# Altium footprint library DIP Component.PcbLib: 327 footprints (part 18 of 21)
Each footprint in its own frame and in the unit in brackets; x right, y up, seen from the top. Pads: shape width x height; smd on the part's side, far side on the other; paste and mask are expansions set on the pad; w line width, h text height; cw(c..) or ccw(c..) is an arc to the next point about the centre after c.
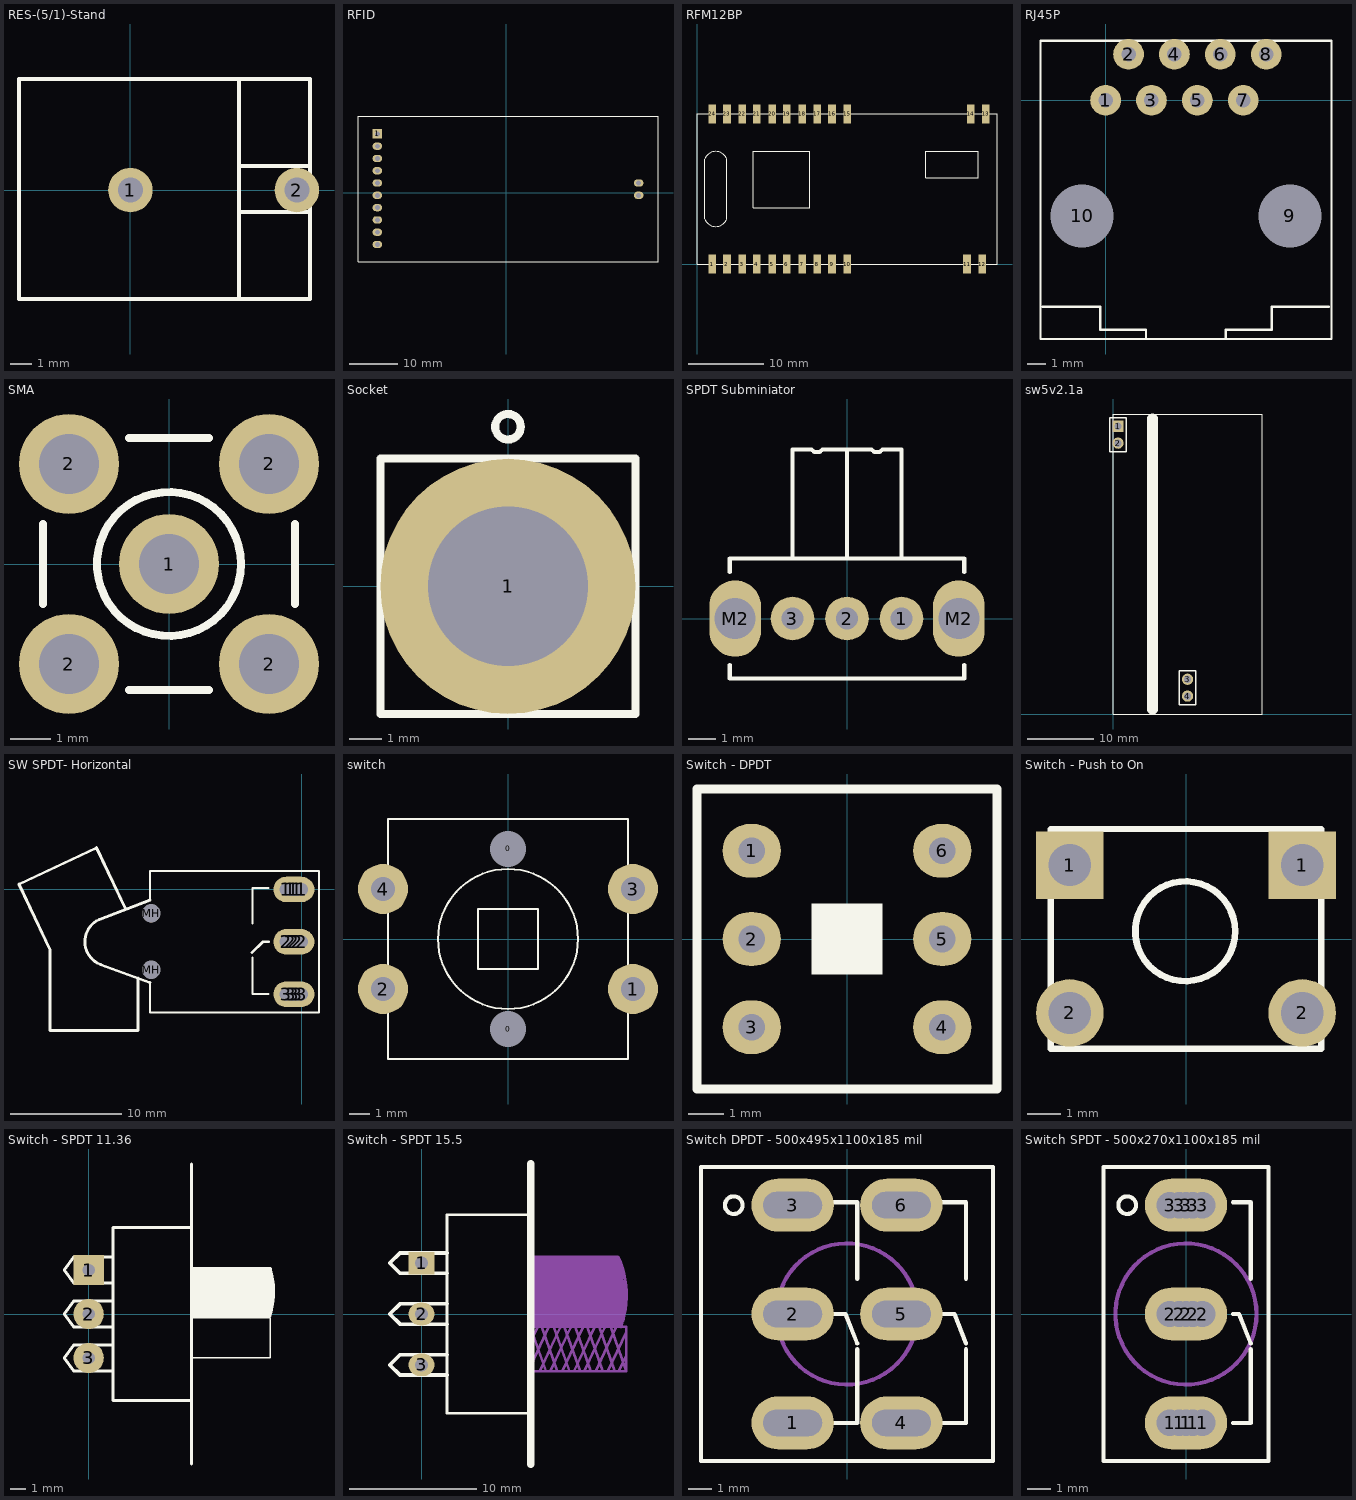
[diagram p17: the footprints below, top view; thin cyan lines are the x and y axes]

## RES-(5/1)-Stand [mil]
pads (2):
  round 80 hole 45: 1(0,0) 2(300,0)
Top Overlay:
  lines w7: 195.69,-196 195.69,200 ; 195.69,-39.37 324,-39.37 ; 195.69,43.31 324,43.31 ; -200.79,-196 324,-196 324,200 -200.79,200 -200.79,-196
3D body "5W Res.STEP": height 907.48, standoff -94.49, extent -195.48,-194 319.48,199.7

## RFID [mm] "RFID 2&10 PIN"
pads (12):
  rect 2x2 hole 1: 1(-26.632,12.141)
  oval 2x1.5 hole 1: 2(-26.632,9.601) 3(-26.632,7.061) 4(-26.632,4.521) 5(-26.632,1.981) 6(-26.632,-0.559) 7(-26.632,-3.099) 8(-26.632,-5.639) 9(-26.632,-8.179) 10(-26.632,-10.719) 11(27.368,1.981) 12(27.368,-0.559)
Top Overlay:
  lines w0.2: -30.632,-14.249 -30.632,15.751 31.368,15.751 31.368,-14.249 -30.632,-14.249
3D body: height 11.1, standoff 0, extent 5.639,-2.184 11.659,6.096
3D body: height 11.1, standoff 0, extent 1.448,-2.21 2.946,6.096
3D body: height 11.1, standoff 0, extent -5.232,-2.261 -0.584,6.096
3D body: height 11.1, standoff 0, extent -13.614,-2.184 -6.579,6.426
3D body: height 11, standoff 0, extent -30.632,-14.249 31.369,15.723

## RFM12BP [mm]
pads (24):
  rect 1x2.5 smd mask+0.5: 1(2,0) 2(4,0) 3(6,0) 4(8,0) 5(10,0) 6(12,0) 7(14,0) 8(16,0) 9(18,0) 10(20,0) 11(36,0) 12(38,0) 13(38.5,20) 14(36.5,20) 15(20,20) 16(18,20) 17(16,20) 18(14,20) 19(12,20) 20(10,20) 21(8,20) 22(6,20) 23(4,20) 24(2,20)
Top Overlay:
  lines w0.1: 0,0 0,20 40,20 40,0 0,0 ; 1,6 ccw(c2.5,6.625) 4,6 4,7.5 4,14 ccw(c2.5,13.375) 1,14 1,7.5 1,6 ; 7.5,7.5 15,7.5 15,15 7.5,15 7.5,10 7.5,7.5 ; 30.5,11.5 37.5,11.5 37.5,15 30.5,15 30.5,14.5 30.5,11.5

## RJ45P [mm]
pads (10):
  round 1.7 hole 0.8: 1(0,0) 2(1.27,2.54) 3(2.54,0) 4(3.81,2.54) 5(5.08,0) 6(6.35,2.54) 7(7.62,0) 8(8.89,2.54)
  round 1.7 hole 3.5: 9(10.2,-6.4) 10(-1.3,-6.4)
Top Overlay:
  lines w0.127: -3.475,-11.43 -0.3,-11.43 -0.3,-12.7 2.24,-12.7 2.24,-13.208 ; 6.65,-13.208 6.65,-12.7 9.19,-12.7 9.19,-11.43 12.365,-11.43 ; -3.6,-13.208 12.5,-13.208 12.5,3.3 -3.6,3.3 -3.6,-13.208
3D body "User Library-CONNECTOR, RJ-45, 8P8C, MOD JACK, TOP ENTRY, CAT 5E, RIA AJT26A8813.step": height 16.3, standoff -3.3, extent -3.3,-12.5 12.2,3.3

## SMA [mm]
pads (5):
  round 2.5 hole 1.5: 1(0,0) 2(-2.5,-2.5) 2(-2.5,2.5) 2(2.5,-2.5) 2(2.5,2.5)
Top Overlay:
  circle w0.2: c0,0 r1.8
  lines w0.2: -3.15,-1 -3.15,1 ; -1,-3.15 1,-3.15 ; -1,3.15 1,3.15 ; 3.15,-1 3.15,1
Mechanical 1:
  circle w0.025: c0,0 r0.2
  circle w0.025: c0,0 r1.05
  circle w0.025: c0,0 r1.8
3D body "User Library-LNB.STEP": height 10.2, standoff -3.5, extent -3.25,-3.25 3.25,3.25

## Socket [mm]
pads (1):
  round 8 hole 5: 1(0,0)
Top Overlay:
  circle w0.254: c0,5 r0.4
  lines w0.254: -4,-4 -4,4 4,4 4,-4 -4,-4
3D body "New Socket-Short.STEP": height 26.7, standoff -4.75, extent -7.075,-7.075 7.075,7.075

## SPDT Subminiator [mm] "Subminiator SPDT switch"
pads (5):
  round 1.6 hole 0.8: 1(2,0) 2(0,0) 3(-2,0)
  oval 1.9x2.8 hole 1.5: M2(-4.1,0) M2(4.1,0)
Top Overlay:
  lines w0.15: -4.3,-1.7 -4.3,-2.2 4.3,-2.2 4.3,-1.7 ; -4.3,1.7 -4.3,2.2 4.3,2.2 4.3,1.7 ; -2,2.2 -2,6.2 ; 0,2.2 0,6.2 ; 2,2.2 2,6.2 1.3,6.2 1.2,6.1 1,6.1 0.9,6.2 0,6.2 ; -2,6.2 -2,6.2 ; -2,6.2 -1.3,6.2 -1.2,6.1 -1,6.1 -0.9,6.2 0,6.2 ; 0,6.2 0,6.2 ; 0,6.2 0,6.2
3D body "User Library-CK_Slide.step": height 4.7, standoff -2.79, extent -4.311,-2.28 4.3,6.093

## sw5v2.1a [mm]
pads (4):
  rect 1.7x1.7 hole 1.1: 1(0.7,43.44)
  round 1.7 hole 1.1: 2(0.7,40.9) 3(11.2,5.24) 4(11.2,2.7)
Top Overlay:
  lines w0.127: 0,0 0,45.3 20.9,45.3 22.5,45.3 22.5,0 0,0
  lines w0.2: -0.57,39.63 1.97,39.63 1.97,44.71 -0.57,44.71 -0.57,39.63 ; 9.93,1.43 9.93,6.51 12.47,6.51 12.47,1.43 9.93,1.43
  lines w1.6: 5.9,0.7 5.9,44.6

## SW SPDT- Horizontal [mil]
pads (17):
  round 90 hole 45: 1(-55.12,0) 1(-39.37,0) 1(-15.75,0) 1(0,0) 2(-55.12,-185.04) 2(-39.37,-185.04) 2(-15.75,-185.04) 2(0,-185.04) 3(-55.12,-370.08) 3(-39.37,-370.08) 3(-15.75,-370.08) 3(0,-370.08)
  oval 140x90 hole 45: 1(-27.56,-0.04) 2(-27.56,-185.04) 3(-27.56,-370.04)
  round 63 hole 65: MH(-531.5,-283.46) MH(-531.5,-84.68)
Top Overlay:
  lines w7: -535.43,-329.21 -535.43,-435.04 61.24,-435.04 61.24,64.96 -535.43,64.96 -535.43,-37.31 ; -174.56,-240.04 -174.56,-370.04 -117.56,-370.04 ; -174.56,-120.04 -174.56,4.96 -117.56,4.96
  lines w10: -715.87,-106.44 ccw(c-680.11,-184.58) -711.99,-264.38 ; -714.57,-106.3 -535.43,-37.31 ; -709.7,-265.56 -535.43,-329.21 ; -622.75,-66.04 -724.75,147.96 -998.75,18.96 -888.75,-214.04 -888.75,-498.04 -577.75,-498.04 -577.75,-313.04 ; -175.75,-223.04 -137.56,-185.04 -117.56,-185.04
3D body "SW3dPS-300-sp1-j1-blk.STEP": height 379.35, standoff -125.15, extent -1002.19,-497.79 1.31,151.08

## switch [mm]
pads (6):
  rect 0.5x0.5 hole 1.8: 0(0,-4.5) 0(0,4.5)
  round 2.5 hole 1.2: 1(6.25,-2.5) 2(-6.25,-2.5) 3(6.25,2.5) 4(-6.25,2.5)
Top Overlay:
  circle w0.1: c0,0 r3.5
  lines w0.1: -6,-6 -6,6 6,6 6,-6 -6,-6 ; -1.5,-1.5 -1.5,1.5 1.5,1.5 1.5,-1.5 -1.5,-1.5

## Switch - DPDT [mil]
pads (6):
  oval 65x60 hole 30: 1(-106.3,98.43) 2(-106.3,0) 3(-106.3,-98.43) 4(106.3,-98.43) 5(106.3,0) 6(106.3,98.43)
Top Overlay:
  rectangle: -39.37,-39.37 39.37,39.37
  lines w10: -167.32,-167.32 167.32,-167.32 167.32,167.32 -167.32,167.32 -167.32,-167.32
3D body "DPDT.STEP": height 559.06, standoff -129.92, extent -167.32,-167.32 167.32,167.32

## Switch - Push to On [mil]
pads (4):
  rect 80x80 hole 50: 1(-137.5,87.5) 1(137.5,87.5)
  round 80 hole 50: 2(-137.5,-87.5) 2(137.5,-87.5)
Top Overlay:
  circle w7.87: c-0.89,9.15 r59.06
  lines w7: -160,130 160,130
  lines w7.87: -160,130 -160,-130 160,-130 160,130
3D body "SW3dPS-Touche DTS-6X_V2008.STEP": height 205.04, standoff -120.04, extent -154.9,-121.09 156.9,123

## Switch - SPDT 11.36 [mm]
pads (3):
  rect 2x2 hole 0.8: 1(0,2.9)
  round 2 hole 0.8: 2(0,0) 3(0,-2.9)
Top Overlay:
  rectangle: 6.8,-0.2 11.982,2.998
  lines w0.1: 6.8,-2.9 11.99,-2.9 11.99,-0.282
  lines w0.2: 1.6,-3.75 -1,-3.75 -1.6,-2.9 -1,-2.05 1.6,-2.05 ; 1.6,-0.85 -1,-0.85 -1.6,0 -1,0.85 1.6,0.85 ; 1.6,2.05 -1,2.05 -1.6,2.9 -1,3.75 1.6,3.75 ; 6.8,-9.9 6.8,9.9 ; 6.8,-5.7 1.6,-5.7 1.6,5.7 6.8,5.7 ; 6.8,-0.2 11.932,-0.201 ccw(c6.8,1.48) 11.982,2.998 6.8,3
  lines w0.3: 12.01,0.47 12.01,2.5

## Switch - SPDT 15.5 [mil]
pads (3):
  rect 80x70 hole 40: 1(0,157.48)
  oval 80x70 hole 40: 2(0,0) 3(0,-157.48)
Top Overlay:
  lines w7.87: 338.58,-307.09 78.74,-307.09 78.74,307.09 338.58,307.09
  lines w11.81: 78.74,-188.98 -66.93,-188.98 -98.43,-157.48 -66.93,-125.98 78.74,-125.98 ; 78.74,-31.5 -66.93,-31.5 -98.43,0 -66.93,31.5 78.74,31.5 ; 78.74,125.98 -66.93,125.98 -98.43,157.48 -66.93,188.98 78.74,188.98
  lines w23.62: 338.58,-464.57 338.58,464.57
Mechanical 3:
  rectangle: 607.87,-23.62 622.44,-9.06
  rectangle: 596.06,158.66 612.6,168.11
  rectangle: 596.06,135.83 619.68,164.17
  rectangle: 596.06,105.51 624.41,135.83
  rectangle: 617.04,-14.17 627.56,22.44
  rectangle: 596.06,-40.38 617.04,12.2
  rectangle: 596.06,12.2 631.5,105.51
  rectangle: 338.58,-39.37 607.48,177.17
  lines w7.87: 331.5,-174.02 394.09,-39.37 ; 337.01,-39.37 385.43,-177.17 ; 338.58,-177.17 633.86,-177.17 ; 338.58,-83.86 359.45,-39.37 ; 338.58,-39.37 633.86,-39.37 633.86,-177.17 ; 338.58,177.17 607.48,177.17 ; 366.14,-177.17 428.74,-42.52 ; 371.65,-39.37 420.08,-177.17 ; 398.82,-177.17 461.42,-42.52 ; 409.84,-39.37 458.27,-177.17 ; 436.22,-177.17 498.82,-42.52 ; 442.52,-39.37 490.94,-177.17 ; 472.05,-177.17 534.65,-42.52 ; 475.98,-39.37 524.41,-177.17 ; 503.94,-177.17 566.54,-42.52 ; 512.99,-39.37 561.42,-177.17 ; 538.98,-177.17 601.57,-42.52 ; 550.39,-39.37 598.82,-177.17 ; 577.17,-177.17 633.86,-56.69 ; 585.43,-39.37 633.86,-177.17 ; 611.02,-177.17 633.86,-128.35
  lines w10: 608.82,176.89 cw(c338.58,57.87) 617.36,-39.48
3D body "spdt.STEP": height 356.3, standoff -157.48, extent -68.5,-462.01 659.84,462.01

## Switch DPDT - 500x495x1100x185 mil [mil]
pads (6):
  oval 140x90 hole 45 slot 100 at 0 deg: 1(-92.5,-185) 2(-92.5,0) 3(-92.5,185) 4(92.5,-185) 5(92.5,0) 6(92.5,185)
Top Overlay:
  circle w7: c-192.5,185 r15
  lines w7: -42.5,0 -2.5,0 17.5,-50 ; -27.5,190 17.5,190 17.5,60 ; -22.5,-185 17.5,-185 17.5,-60 ; 142.5,0 182.5,0 202.5,-50 ; 157.5,190 202.5,190 202.5,60 ; 162.5,-185 202.5,-185 202.5,-60 ; -248,-250 248,-250 248,250 -248,250 -248,-250
Mechanical 1:
  circle w7: c0,0 r120
3D body "SWITCH DPDT.STEP": height 1121.73, standoff -100, extent -246.5,-250 248.5,250

## Switch SPDT - 500x270x1100x185 mil [mil]
pads (15):
  round 40 hole 45: 1(-27.56,-185.04) 1(-11.81,-185.04) 1(11.81,-185.04) 1(27.56,-185.04) 2(-27.56,0) 2(-11.81,0) 2(11.81,0) 2(27.56,0) 3(-27.56,185.04) 3(-11.81,185.04) 3(11.81,185.04) 3(27.56,185.04)
  oval 140x90 hole 45: 1(0,-185) 2(0,0) 3(0,185)
Top Overlay:
  circle w7: c-100,185 r15
  lines w7: 79.72,-185 110,-185 110,-60 ; 79.72,0 90,0 110,-50 ; 79.72,190 110,190 110,60 ; -140,-250 -140,250 140,250 140,-250 -140,-250
Mechanical 1:
  circle w7: c0,0 r120
3D body "SWITCH SPDT.STEP": height 1126.73, standoff -95, extent -134.47,-250 135.53,250